# Altium footprint library bhumishboard.PcbLib: 75 footprints (part 1 of 5)
Each footprint in its own frame and in the unit in brackets; x right, y up, seen from the top. Pads: shape width x height; smd on the part's side, far side on the other; paste and mask are expansions set on the pad; w line width, h text height; cw(c..) or ccw(c..) is an arc to the next point about the centre after c.
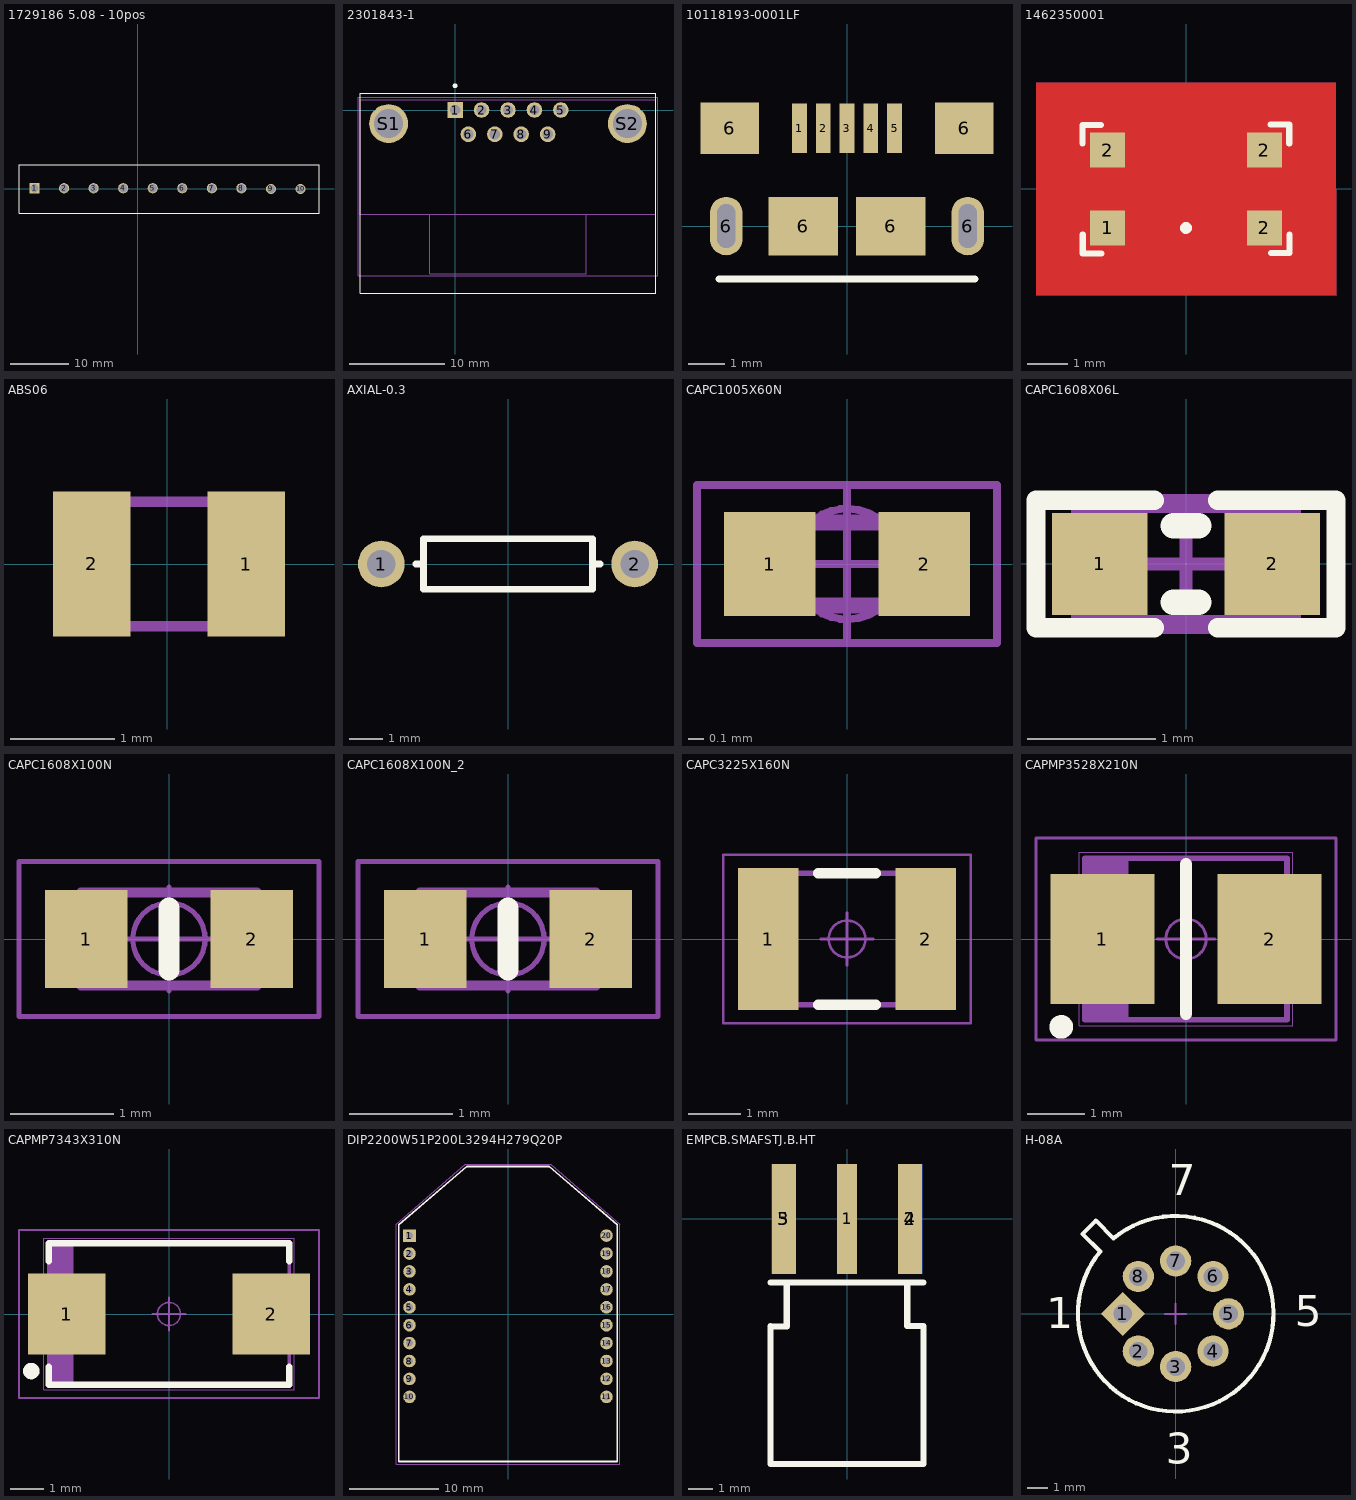
[diagram p0: the footprints below, top view; thin cyan lines are the x and y axes]

## 1729186 5.08 - 10pos [mm]
height 8.51
pads (10):
  rect 1.75x1.75 hole 1.4: 1(-17.78,0.127)
  round 1.75 hole 1.4: 2(-12.7,0.127) 3(-7.62,0.127) 4(-2.54,0.127) 5(2.54,0.127) 6(7.62,0.127) 7(12.7,0.127) 8(17.78,0.127) 9(22.86,0) 10(27.94,0)
Top Overlay:
  lines w0.127: -20.447,-4.191 31.115,-4.191 31.115,4.191 -20.447,4.191 -20.447,-4.191
3D body "pxc_1729186_07_MKDSN-1-5-8-5-08_3D.stp": height 10, standoff -3.5, extent -10.191,-4.064 31.019,4.036
3D body "pxc_1729186_07_MKDSN-1-5-8-5-08_3D.stp": height 10, standoff -3.5, extent -20.351,-4.064 20.859,4.036

## 2301843-1 [mm]
pads (11):
  rect 1.635x1.635 hole 1.09: 1(0,0)
  round 1.635 hole 1.09: 2(2.77,0) 3(5.54,0) 4(8.31,0) 5(11.08,0) 6(1.39,-2.54) 7(4.16,-2.54) 8(6.92,-2.54) 9(9.69,-2.54)
  round 4.066 hole 3.05: S1(-6.96,-1.42) S2(18.04,-1.42)
Top Overlay:
  circle w0.3: c0,2.54 r0.1
  lines w0.127: -9.91,-19.177 20.99,-19.177 20.99,1.778 -9.91,1.778 -9.91,-19.177
Mechanical 13:
  lines w0.127: -2.66,-10.92 13.74,-10.92 ; -2.66,-10.92 -9.91,-10.92 -9.91,1.08 20.99,1.08 20.99,-10.92 13.74,-10.92 ; -2.66,-10.92 -2.66,-17.12 13.74,-17.12 13.74,-10.92
Mechanical 15:
  lines w0.05: -10.16,-17.37 -10.16,1.33 21.24,1.33 21.24,-17.37 -10.16,-17.37
3D body "c-2301843-1-b-3d.stp": height 14.41, standoff -2.97, extent -9.817,-19.05 20.993,1.6

## 10118193-0001LF [mm] "Connector Receptacle USB - micro B 2.0 5 Position Surface Mount, Right Angle, Horizontal"
height 1
pads (11):
  rect 0.4x1.35 smd: 1(-1.3,2.675) 2(-0.65,2.675) 3(0,2.675) 4(0.65,2.675) 5(1.3,2.675)
  oval 0.9x1.6 hole 0.5 slot 1.2 at 90 deg: 6(-3.3,0) 6(3.3,0)
  rect 1.6x1.4 smd: 6(-3.2,2.675) 6(3.2,2.675)
  rect 1.9x1.6 smd: 6(-1.2,0) 6(1.2,0)
Top Overlay:
  lines w0.2: -3.5,-1.45 3.5,-1.45
3D body "10118193-0001lfc.stp": height 2.83, standoff -0.77, extent -3.928,-2.74 3.928,2.921

## 1462350001 [mm]
height 9.5
pads (4):
  rect 0.87x0.87 smd paste+0: 1(-1.95,-0.97) 2(-1.95,0.97) 2(1.95,-0.97) 2(1.95,0.97)
Top Layer:
  pour cut-out: -3.734,2.642 3.734,2.642 3.734,-2.642 -3.734,-2.642
Bottom Layer:
  pour cut-out: -3.734,2.642 3.734,2.642 3.734,-2.642 -3.734,-2.642
Top Overlay:
  circle w0.25: c0,-0.97 r0.02
  lines w0.15: -2.58,1.128 -2.58,1.59 -2.118,1.59 ; -2.57,-1.138 -2.57,-1.6 -2.108,-1.6 ; 2.108,1.6 2.57,1.6 2.57,1.138 ; 2.118,-1.59 2.58,-1.59 2.58,-1.128
Mechanical 7:
  circle w0.1: c0,0 r0.559
  lines w0.1: -2.58,0 -0.533,0 ; 0,-1.59 0,-0.559 ; 0,0.559 0,1.6 ; 0.559,0 2.555,0 ; -2.58,-1.59 -2.58,1.6 2.57,1.6 2.57,-1.59 -2.58,-1.59
Mechanical 15:
  lines w0.05: -2.57,-1.6 2.565,-1.6 2.565,1.6 -2.57,1.6 -2.57,-1.6
  lines w0.1: -0.5,0 0.5,0 ; 0,-0.5 0,0.5
3D body "1462350001.stp": height 4, standoff 0, extent -2.544,-1.552 2.526,1.518

## ABS06 [mm] "32.768kHz ±20ppm Crystal 4pF 60 kOhm -40°C ~ 85°C Surface Mount 2-SMD, No Lead"
height 1
pads (2):
  rect 0.75x1.4 smd: 1(0.762,0) 2(-0.725,0)
Mechanical 13:
  lines w0.1: -1,-0.6 -1,0.6 1,0.6 1,-0.6 -1,-0.6
3D body "ABS06-107.STEP": height 0.61, standoff 0, extent -1.004,-0.597 1.003,0.597

## AXIAL-0.3 [mm] "Axial Device, Thru-Hole; 2 Leads; 0.3 in Pin Spacing"
height 1.524
pads (2):
  round 1.4 hole 0.85: 1(-3.81,0) 2(3.81,0)
Top Overlay:
  lines w0.2: -2.769,0 -2.54,0 ; 2.769,0 2.54,0 ; 2.54,0 2.54,-0.762 -2.54,-0.762 -2.54,0.762 2.54,0.762 2.54,0

## CAPC1005X60N [mm] "Ceramic Capacitor 0402 (1005 metric), max height 0.5mm"
height 0.5
pads (2):
  rect 0.58x0.66 smd: 1(-0.49,0) 2(0.49,0)
Mechanical 1:
  circle w0.05: c0,0 r0.35
  lines w0.05: -0.5,0 0.5,0 ; 0,-0.5 0,0.5 ; -0.95,-0.5 0.95,-0.5 0.95,0.5 -0.95,0.5 -0.95,-0.5
Mechanical 2:
  lines w0.001: -0.5,-0.25 0.5,-0.25 0.5,0.25 -0.5,0.25 -0.5,-0.25
Mechanical 3:
  lines w0.1: -0.512,-0.262 0.512,-0.262 0.512,0.262 -0.512,0.262 -0.512,-0.262
3D body "User Library-CAPC1005X06.step": height 0.6, standoff 0, extent -0.5,-0.25 0.5,0.25

## CAPC1608X06L [mm]
pads (2):
  rect 0.75x0.8 smd: 1(-0.675,0) 2(0.675,0)
Top Overlay:
  lines w0.152: -0.25,-0.5 -1.175,-0.5 -1.175,0.5 -0.25,0.5 ; 0.25,-0.5 1.175,-0.5 1.175,0.5 0.25,0.5
  lines w0.2: -0.1,-0.3 0.1,-0.3 ; -0.1,0.3 0.1,0.3
Mechanical 13:
  lines w0.1: -0.85,-0.45 -0.85,0.45 0.85,0.45 0.85,-0.45 -0.85,-0.45
Mechanical 15:
  lines w0.1: -0.45,0 0.45,0 ; 0,-0.45 0,0.45 ; -1.175,-0.5 1.175,-0.5 1.175,0.5 -1.175,0.5 -1.175,-0.5
3D body "User Library-Chip Capacitor 0603.step": height 0.8, standoff 0, extent -0.8,-0.43 0.8,0.43

## CAPC1608X100N [mm] "Capacitor, non-Polarized, Chip; 1.60mm L X 0.80mm W X 1.00mm H, IPC Medium Density"
height 1
pads (2):
  rect 0.8x0.95 smd: 1(-0.8,0) 2(0.8,0)
Top Overlay:
  lines w0.2: 0,-0.3 0,0.3
Mechanical 14:
  lines w0.1: -0.85,-0.45 -0.85,0.45 0.85,0.45 0.85,-0.45 -0.85,-0.45
Mechanical 15:
  circle w0.05: c0,0 r0.35
  lines w0.05: -0.5,0 0.5,0 ; 0,-0.5 0,0.5 ; -1.45,-0.75 -1.45,0.75 1.45,0.75 1.45,-0.75 -1.45,-0.75
3D body "CAPC1608X100N.stp": height 1, standoff 0, extent -0.85,-0.45 0.85,0.45

## CAPC1608X100N_2 [mm]
pads (2):
  rect 0.8x0.95 smd: 1(-0.8,0) 2(0.8,0)
Top Overlay:
  lines w0.2: 0,-0.3 0,0.3
Mechanical 14:
  lines w0.1: -0.85,-0.45 0.85,-0.45 0.85,0.45 -0.85,0.45 -0.85,-0.45
Mechanical 15:
  circle w0.05: c0,0 r0.35
  lines w0.05: -0.5,0 0.5,0 ; 0,-0.5 0,0.5 ; -1.45,-0.75 1.45,-0.75 1.45,0.75 -1.45,0.75 -1.45,-0.75
3D body "CAPC1608X100N.stp": height 1, standoff 0, extent -0.85,-0.45 0.85,0.45

## CAPC3225X160N [mm]
height 1.9
pads (2):
  rect 1.15x2.7 smd: 1(-1.5,0) 2(1.5,0)
Top Overlay:
  lines w0.2: -0.55,-1.25 0.55,-1.25 ; -0.55,1.25 0.55,1.25
Mechanical 1:
  circle w0.05: c0,0 r0.35
  lines w0.05: -0.5,0 0.5,0 ; 0,-0.5 0,0.5 ; -2.35,-1.6 -2.35,1.6 2.35,1.6 2.35,-1.6 -2.35,-1.6
Mechanical 2:
  lines w0.001: -1.6,-1.26 -1.6,1.26 1.6,1.26 1.6,-1.26 -1.6,-1.26
Mechanical 3:
  lines w0.1: -1.6,-1.25 -1.6,1.25 1.6,1.25 1.6,-1.25 -1.6,-1.25
3D body "User Library-CAPC3225X___.step": height 1.62, standoff 0, extent -1.6,-1.26 1.6,1.26

## CAPMP3528X210N [mm]
height 1.9
pads (2):
  rect 1.8x2.25 smd: 1(-1.45,0) 2(1.45,0)
Top Overlay:
  circle w0.25: c-2.163,-1.524 r0.08
  lines w0.2: 0,-1.3 0,1.3
Mechanical 1:
  circle w0.05: c0,0 r0.35
  lines w0.05: -0.5,0 0.5,0 ; 0,-0.5 0,0.5 ; -2.6,-1.75 2.6,-1.75 2.6,1.75 -2.6,1.75 -2.6,-1.75
Mechanical 2:
  lines w0.001: -1.85,-1.5 1.85,-1.5 1.85,1.5 -1.85,1.5 -1.85,-1.5
Mechanical 3:
  lines w0.1: -1.65,-1.4 -1.65,1.4 ; -1.55,-1.4 -1.55,1.4 ; -1.45,-1.4 -1.45,1.4 ; -1.35,-1.4 -1.35,1.4 ; -1.25,-1.4 -1.25,1.4 ; -1.15,-1.4 -1.15,1.4 ; -1.05,-1.4 -1.05,1.4 ; -1.75,-1.4 1.75,-1.4 1.75,1.4 -1.75,1.4 ; -1.75,-1.4 -1.75,1.4 ; -1.75,-1.4 -1.75,1.4
3D body: height 1.9, standoff 0, extent -1.85,-1.5 -0.991,1.5
3D body: height 1.9, standoff 0, extent -0.991,-1.5 1.85,1.5

## CAPMP7343X310N [mm]
height 2.8
pads (2):
  rect 2.35x2.45 smd: 1(-3.1,0) 2(3.1,0)
Top Overlay:
  circle w0.25: c-4.176,-1.73 r0.125
  lines w0.2: -3.65,-1.6 -3.65,-2.15 3.65,-2.15 3.65,-1.6 ; -3.65,1.6 -3.65,2.15 3.65,2.15 3.65,1.6
Mechanical 1:
  circle w0.05: c0,0 r0.35
  lines w0.05: -0.5,0 0.5,0 ; 0,-0.5 0,0.5 ; -4.55,-2.55 4.55,-2.55 4.55,2.55 -4.55,2.55 -4.55,-2.55
Mechanical 2:
  lines w0.001: -3.8,-2.3 3.8,-2.3 3.8,2.3 -3.8,2.3 -3.8,-2.3
Mechanical 3:
  lines w0.1: -3.55,-2.15 -3.55,2.15 ; -3.45,-2.15 -3.45,2.15 ; -3.35,-2.15 -3.35,2.15 ; -3.25,-2.15 -3.25,2.15 ; -3.15,-2.15 -3.15,2.15 ; -3.05,-2.15 -3.05,2.15 ; -2.95,-2.15 -2.95,2.15 ; -3.65,-2.15 3.65,-2.15 3.65,2.15 -3.65,2.15 ; -3.65,-2.15 -3.65,2.15 ; -3.65,-2.15 -3.65,2.15
3D body: height 2.8, standoff 0, extent -2.9,-2.3 3.8,2.3
3D body: height 2.8, standoff 0, extent -3.8,-2.3 -2.9,2.3

## DIP2200W51P200L3294H279Q20P [mm]
pads (20):
  rect 1.4x1.4 hole 0.8: 1(-11,8.75)
  round 1.4 hole 0.8: 2(-11,6.75) 3(-11,4.75) 4(-11,2.75) 5(-11,0.75) 6(-11,-1.25) 7(-11,-3.25) 8(-11,-5.25) 9(-11,-7.25) 10(-11,-9.25) 11(11,-9.25) 12(11,-7.25) 13(11,-5.25) 14(11,-3.25) 15(11,-1.25) 16(11,0.75) 17(11,2.75) 18(11,4.75) 19(11,6.75) 20(11,8.75)
Top Overlay:
  lines w0.2: -12.19,-16.47 -12.19,9.94 -4.6,16.47 4.6,16.47 12.19,9.94 12.19,-16.47 -12.19,-16.47
Mechanical 15:
  lines w0.05: -12.5,-16.75 12.5,-16.75 12.5,10 4.75,16.75 -4.75,16.75 -12.5,10 -12.5,-16.75
3D body "User Library-XBeeProS1-1.step": height 13.5, standoff -3.06, extent -11.611,-16.592 12.119,16.348

## EMPCB.SMAFSTJ.B.HT [mm] "SMA Connector Jack, Female Socket 50 Ohm Board Edge, End Launch Solder"
pads (5):
  rect 0.85x4.56 smd: 1(0,0)
  rect 1x4.56 smd: 2(2.62,0) 3(-2.62,0)
  rect 1x4.56 smd far side: 4(2.62,0) 5(-2.62,0)
Top Overlay:
  lines w0.254: -3.175,-4.468 -2.5,-4.468 ; -3.175,-4.443 -3.175,-10.168 3.175,-10.168 3.175,-4.443 2.5,-4.443 2.5,-2.643 ; -3.175,-2.643 3.175,-2.643 ; -2.5,-4.443 -2.5,-2.643
3D body "SMA CONNECTOR - EMPCB.SMAFSTJ.B.HT v1.step": height 3.56, standoff -2.79, extent -3.175,-12.03 3.175,1.27

## H-08A [mm] "Can; 8 Leads; Pin Circle Dia. 5.08 mm; Lead Dia. 0.53 mm (max)"
height 4.7
pads (8):
  rect 1.5x1.5 hole 0.9 rot 45: 1(-2.54,0)
  round 1.5 hole 0.9: 2(-1.796,-1.796) 3(0,-2.54) 4(1.796,-1.796) 5(2.54,0) 6(1.796,1.796) 7(0,2.54) 8(-1.796,1.796)
Top Overlay:
  lines w0.2: -4.475,3.838 -3.626,2.99 ccw(c0,0) -2.99,3.626 -3.838,4.475 -4.475,3.838
  text "7" at -0.332,5.7 h1.5
  text "5" at 5.712,-0.589 h1.5
  text "3" at -0.469,-7.22 h1.5
  text "1" at -6.22,-0.696 h1.5
Mechanical 15:
  lines w0.1: -0.5,0 0.5,0 ; 0,-0.5 0,0.5